# Altium schematic symbol library SCHLIB.SchLib: 2608 symbols (part 4 of 20) (continued)
## FB-BLM18AG121BH1D (continued)
FERRITE BEAD 120 OHM 0603 1 LN; Manufacturer Part Number: BLM18AG121BH1D; Manufacturer: Murata Electronics; Filter Type: Power Line; Number of Lines: 1; Impedance @ Frequency: 120 Ohms @ 100 MHz; DCR: 180mOhm; Object  Type: Part; Design Item ID: FB-BLM18AG121BH1D; Series: BLM18; Ratings: AEC-Q200; Operating Temperature: -55°C ~ 150°C; Mounting Type: Surface Mount; Height: 0.95mm; Size: 1.60mm x 0.80mm; Category: Bead
footprint FB0603
pins: 1, 2

## FB-BLM18AG121SH1D
designator FB?  Current Rating: 800mA  Package: 0603
FERRITE BEAD 120 OHM 0603 1LN; Manufacturer Part Number: BLM18AG121SH1D; Manufacturer: Murata Electronics; Number of Lines: 1; Impedance @ Frequency: 120 Ohms @ 100 MHz; DCR: 180mOhm; Object  Type: Part; Design Item ID: FB-BLM18AG121SH1D; Series: BLM18; Filter Type: -; Ratings: AEC-Q200; Operating Temperature: -55°C ~ 125°C; Mounting Type: Surface Mount; Height: 0.95mm; Size: 1.60mm x 0.80mm; Category: Bead
footprint FB0603
pins: 1, 2

## FB-BLM18AG121SZ1D
designator FB?  Current Rating: 500mA  Package: 0603
FERRITE BEAD 120 OHM 0201 1LN; Manufacturer Part Number: BLM18AG121SZ1D; Manufacturer: Murata Electronics; Filter Type: Signal Line; Number of Lines: 1; DCR: 180mOhm; Object  Type: Part; Design Item ID: FB-BLM18AG121SZ1D; Series: BLM18; Impedance @ Frequency: -; Ratings: AEC-Q200; Operating Temperature: -55°C ~ 125°C; Mounting Type: Surface Mount; Height: 0.37mm; Size: 1.60mm x 0.80mm; Category: Bead
footprint FB0603
pins: 1, 2

## FB-BLM18AG151BH1D
designator FB?  Current Rating: 700mA  Package: 0603
FERRITE BEAD 150 OHM 0603 1 LN; Manufacturer Part Number: BLM18AG151BH1D; Manufacturer: Murata Electronics; Filter Type: Power Line; Number of Lines: 1; Impedance @ Frequency: 150 Ohms @ 100 MHz; DCR: 250mOhm; Object  Type: Part; Design Item ID: FB-BLM18AG151BH1D; Series: BLM18; Ratings: AEC-Q200; Operating Temperature: -55°C ~ 150°C; Mounting Type: Surface Mount; Height: 0.95mm; Size: 1.60mm x 0.80mm; Category: Bead
footprint FB0603
pins: 1, 2

## FB-BLM18AG221BH1D
designator FB?  Current Rating: 700mA  Package: 0603
FERRITE BEAD 220 OHM 0603 1 LN; Manufacturer Part Number: BLM18AG221BH1D; Manufacturer: Murata Electronics; Filter Type: Power Line; Number of Lines: 1; Impedance @ Frequency: 220 Ohms @ 100 MHz; DCR: 250mOhm; Object  Type: Part; Design Item ID: FB-BLM18AG221BH1D; Series: BLM18; Ratings: AEC-Q200; Operating Temperature: -55°C ~ 150°C; Mounting Type: Surface Mount; Height: 0.95mm; Size: 1.60mm x 0.80mm; Category: Bead
footprint FB0603
pins: 1, 2

## FB-BLM18AG221SH1D
designator FB?  Current Rating: 700mA  Package: 0603
FERRITE BEAD 220 OHM 0603 1LN; Manufacturer Part Number: BLM18AG221SH1D; Manufacturer: Murata Electronics; Number of Lines: 1; Impedance @ Frequency: 220 Ohms @ 100 MHz; DCR: 250mOhm; Object  Type: Part; Design Item ID: FB-BLM18AG221SH1D; Series: BLM18; Filter Type: -; Ratings: AEC-Q200; Operating Temperature: -55°C ~ 125°C; Mounting Type: Surface Mount; Height: 0.95mm; Size: 1.60mm x 0.80mm; Category: Bead
footprint FB0603
pins: 1, 2

## FB-BLM18AG331BH1D
designator FB?  Current Rating: 600mA  Package: 0603
FERRITE BEAD 330 OHM 0603 1 LN; Manufacturer Part Number: BLM18AG331BH1D; Manufacturer: Murata Electronics; Filter Type: Power Line; Number of Lines: 1; Impedance @ Frequency: 330 Ohms @ 100 MHz; DCR: 300mOhm; Object  Type: Part; Design Item ID: FB-BLM18AG331BH1D; Series: BLM18; Ratings: AEC-Q200; Operating Temperature: -55°C ~ 150°C; Mounting Type: Surface Mount; Height: 0.95mm; Size: 1.60mm x 0.80mm; Category: Bead
footprint FB0603
pins: 1, 2

## FB-BLM18AG331SH1D
designator FB?  Current Rating: 600mA  Package: 0603
FERRITE BEAD 330 OHM 0603 1LN; Manufacturer Part Number: BLM18AG331SH1D; Manufacturer: Murata Electronics; Filter Type: Signal Line; Number of Lines: 1; Impedance @ Frequency: 330 Ohms @ 100 MHz; DCR: 300mOhm; Object  Type: Part; Design Item ID: FB-BLM18AG331SH1D; Series: BLM18; Ratings: AEC-Q200; Operating Temperature: -55°C ~ 125°C; Mounting Type: Surface Mount; Height: 0.95mm; Size: 1.60mm x 0.80mm; Category: Bead
footprint FB0603
pins: 1, 2

## FB-BLM18AG471BH1D
designator FB?  Current Rating: 550mA  Package: 0603
FERRITE BEAD 470 OHM 0603 1 LN; Manufacturer Part Number: BLM18AG471BH1D; Manufacturer: Murata Electronics; Filter Type: Power Line; Number of Lines: 1; Impedance @ Frequency: 470 Ohms @ 100 MHz; DCR: 350mOhm; Object  Type: Part; Design Item ID: FB-BLM18AG471BH1D; Series: BLM18; Ratings: AEC-Q200; Operating Temperature: -55°C ~ 150°C; Mounting Type: Surface Mount; Height: 0.95mm; Size: 1.60mm x 0.80mm; Category: Bead
footprint FB0603
pins: 1, 2

## FB-BLM18AG471SH1D
designator FB?  Current Rating: 550mA  Package: 0603
FERRITE BEAD 470 OHM 0603 1LN; Manufacturer Part Number: BLM18AG471SH1D; Manufacturer: Murata Electronics; Number of Lines: 1; Impedance @ Frequency: 470 Ohms @ 100 MHz; DCR: 350mOhm; Object  Type: Part; Design Item ID: FB-BLM18AG471SH1D; Series: BLM18; Filter Type: -; Ratings: AEC-Q200; Operating Temperature: -55°C ~ 125°C; Mounting Type: Surface Mount; Height: 0.95mm; Size: 1.60mm x 0.80mm; Category: Bead
footprint FB0603
pins: 1, 2

## FB-BLM18AG471WH1D
designator FB?  Current Rating: 200mA  Package: 0603
FERRITE BEAD 470 OHM 0603 1LN; Manufacturer Part Number: BLM18AG471WH1D; Manufacturer: Murata Electronics; Number of Lines: 1; Impedance @ Frequency: 470 Ohms @ 100 MHz; DCR: 200mOhm; Object  Type: Part; Design Item ID: FB-BLM18AG471WH1D; Series: BLM18; Filter Type: -; Ratings: AEC-Q200; Operating Temperature: -55°C ~ 150°C; Mounting Type: Surface Mount, Epoxy; Height: 0.95mm; Size: 1.60mm x 0.80mm; Category: Bead
footprint FB0603
pins: 1, 2

## FB-BLM18AG601BH1D
designator FB?  Current Rating: 500mA  Package: 0603
FERRITE BEAD 600 OHM 0603 1 LN; Manufacturer Part Number: BLM18AG601BH1D; Manufacturer: Murata Electronics; Filter Type: Power Line; Number of Lines: 1; Impedance @ Frequency: 600 Ohms @ 100 MHz; DCR: 380mOhm; Object  Type: Part; Design Item ID: FB-BLM18AG601BH1D; Series: BLM18; Ratings: AEC-Q200; Operating Temperature: -55°C ~ 150°C; Mounting Type: Surface Mount; Height: 0.95mm; Size: 1.60mm x 0.80mm; Category: Bead
footprint FB0603
pins: 1, 2

## FB-BLM18AG601SH1D
designator FB?  Current Rating: 500mA  Package: 0603
FERRITE BEAD 600 OHM 0603 1LN; Manufacturer Part Number: BLM18AG601SH1D; Manufacturer: Murata Electronics; Number of Lines: 1; Impedance @ Frequency: 600 Ohms @ 100 MHz; DCR: 380mOhm; Object  Type: Part; Design Item ID: FB-BLM18AG601SH1D; Series: BLM18; Filter Type: -; Ratings: AEC-Q200; Operating Temperature: -55°C ~ 125°C; Mounting Type: Surface Mount; Height: 0.95mm; Size: 1.60mm x 0.80mm; Category: Bead
footprint FB0603
pins: 1, 2

## FB-BLM18BB100SH1D
designator FB?  Current Rating: 700mA  Package: 0603
FERRITE BEAD 10 OHM 0603 1LN; Manufacturer Part Number: BLM18BB100SH1D; Manufacturer: Murata Electronics; Filter Type: Signal Line; Number of Lines: 1; Impedance @ Frequency: 10 Ohms @ 100 MHz; DCR: 100mOhm; Object  Type: Part; Design Item ID: FB-BLM18BB100SH1D; Series: BLM18; Ratings: AEC-Q200; Operating Temperature: -55°C ~ 125°C; Mounting Type: Surface Mount; Height: 0.95mm; Size: 1.60mm x 0.80mm; Category: Bead
footprint FB0603
pins: 1, 2

## FB-BLM18BB221SH1D
designator FB?  Current Rating: 450mA  Package: 0603
FERRITE BEAD 220 OHM 0603 1LN; Manufacturer Part Number: BLM18BB221SH1D; Manufacturer: Murata Electronics; Filter Type: Signal Line; Number of Lines: 1; Impedance @ Frequency: 220 Ohms @ 100 MHz; DCR: 450mOhm; Object  Type: Part; Design Item ID: FB-BLM18BB221SH1D; Series: BLM18; Ratings: AEC-Q200; Operating Temperature: -55°C ~ 125°C; Mounting Type: Surface Mount; Height: 0.95mm; Size: 1.60mm x 0.80mm; Category: Bead
footprint FB0603
pins: 1, 2

## FB-BLM18BB470SH1D
designator FB?  Current Rating: 550mA  Package: 0603
FERRITE BEAD 47 OHM 0603 1LN; Manufacturer Part Number: BLM18BB470SH1D; Manufacturer: Murata Electronics; Filter Type: Signal Line; Number of Lines: 1; Impedance @ Frequency: 47 Ohms @ 100 MHz; DCR: 250mOhm; Object  Type: Part; Design Item ID: FB-BLM18BB470SH1D; Series: BLM18; Ratings: AEC-Q200; Operating Temperature: -55°C ~ 125°C; Mounting Type: Surface Mount; Height: 0.95mm; Size: 1.60mm x 0.80mm; Category: Bead
footprint FB0603
pins: 1, 2

## FB-BLM18BD102BH1D
designator FB?  Current Rating: 200mA  Package: 0603
FERRITE BEAD 1 KOHM 0603 1 LN; Manufacturer Part Number: BLM18BD102BH1D; Manufacturer: Murata Electronics; Filter Type: Power Line; Number of Lines: 1; Impedance @ Frequency: 1 kOhms @ 100 MHz; DCR: 850mOhm; Object  Type: Part; Design Item ID: FB-BLM18BD102BH1D; Series: BLM18; Ratings: AEC-Q200; Operating Temperature: -55°C ~ 150°C; Mounting Type: Surface Mount; Height: 0.95mm; Size: 1.60mm x 0.80mm; Category: Bead
footprint FB0603
pins: 1, 2

## FB-BLM18BD102SH1D
designator FB?  Current Rating: 200mA  Package: 0603
FERRITE BEAD 1 KOHM 0603 1LN; Manufacturer Part Number: BLM18BD102SH1D; Manufacturer: Murata Electronics; Filter Type: Signal Line; Number of Lines: 1; Impedance @ Frequency: 1 kOhms @ 100 MHz; DCR: 850mOhm; Object  Type: Part; Design Item ID: FB-BLM18BD102SH1D; Series: BLM18; Ratings: AEC-Q200; Operating Temperature: -55°C ~ 125°C; Mounting Type: Surface Mount; Height: 0.95mm; Size: 1.60mm x 0.80mm; Category: Bead
footprint FB0603
pins: 1, 2

## FB-BLM18BD121BH1D
designator FB?  Current Rating: 300mA  Package: 0603
FERRITE BEAD 120 OHM 0603 1 LN; Manufacturer Part Number: BLM18BD121BH1D; Manufacturer: Murata Electronics; Filter Type: Power Line; Number of Lines: 1; Impedance @ Frequency: 120 Ohms @ 100 MHz; DCR: 400mOhm; Object  Type: Part; Design Item ID: FB-BLM18BD121BH1D; Series: BLM18; Ratings: AEC-Q200; Operating Temperature: -55°C ~ 150°C; Mounting Type: Surface Mount; Height: 0.95mm; Size: 1.60mm x 0.80mm; Category: Bead
footprint FB0603
pins: 1, 2

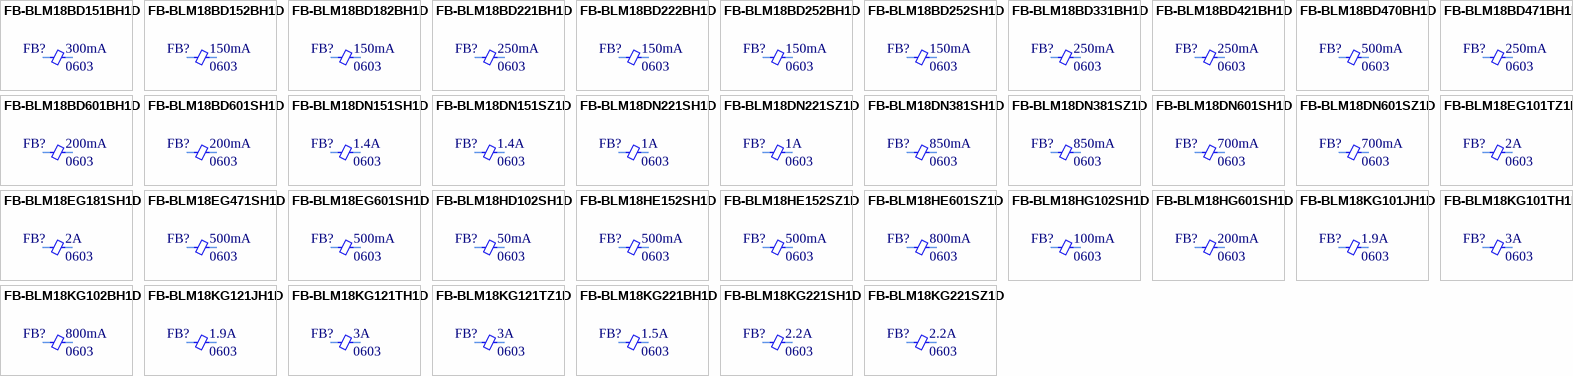
[diagram p14: symbols FB-BLM18BD151BH1D to FB-BLM18KG221SZ1D]

## FB-BLM18BD151BH1D
designator FB?  Current Rating: 300mA  Package: 0603
FERRITE BEAD 150 OHM 0603 1 LN; Manufacturer Part Number: BLM18BD151BH1D; Manufacturer: Murata Electronics; Filter Type: Power Line; Number of Lines: 1; Impedance @ Frequency: 150 Ohms @ 100 MHz; DCR: 400mOhm; Object  Type: Part; Design Item ID: FB-BLM18BD151BH1D; Series: BLM18; Ratings: AEC-Q200; Operating Temperature: -55°C ~ 150°C; Mounting Type: Surface Mount; Height: 0.95mm; Size: 1.60mm x 0.80mm; Category: Bead
footprint FB0603
pins: 1, 2

## FB-BLM18BD152BH1D
designator FB?  Current Rating: 150mA  Package: 0603
FERRITE BEAD 1.5 KOHM 0603 1 LN; Manufacturer Part Number: BLM18BD152BH1D; Manufacturer: Murata Electronics; Filter Type: Power Line; Number of Lines: 1; Impedance @ Frequency: 1.5 kOhms @ 100 MHz; DCR: 1.2Ohm; Object  Type: Part; Design Item ID: FB-BLM18BD152BH1D; Series: BLM18; Ratings: AEC-Q200; Operating Temperature: -55°C ~ 150°C; Mounting Type: Surface Mount; Height: 0.95mm; Size: 1.60mm x 0.80mm; Category: Bead
footprint FB0603
pins: 1, 2

## FB-BLM18BD182BH1D
designator FB?  Current Rating: 150mA  Package: 0603
FERRITE BEAD 1.8 KOHM 0603 1 LN; Manufacturer Part Number: BLM18BD182BH1D; Manufacturer: Murata Electronics; Filter Type: Power Line; Number of Lines: 1; Impedance @ Frequency: 1.8 kOhms @ 100 MHz; DCR: 1.5Ohm; Object  Type: Part; Design Item ID: FB-BLM18BD182BH1D; Series: BLM18; Ratings: AEC-Q200; Operating Temperature: -55°C ~ 150°C; Mounting Type: Surface Mount; Height: 0.95mm; Size: 1.60mm x 0.80mm; Category: Bead
footprint FB0603
pins: 1, 2

## FB-BLM18BD221BH1D
designator FB?  Current Rating: 250mA  Package: 0603
FERRITE BEAD 220 OHM 0603 1 LN; Manufacturer Part Number: BLM18BD221BH1D; Manufacturer: Murata Electronics; Filter Type: Power Line; Number of Lines: 1; Impedance @ Frequency: 220 Ohms @ 100 MHz; DCR: 450mOhm; Object  Type: Part; Design Item ID: FB-BLM18BD221BH1D; Series: BLM18; Ratings: AEC-Q200; Operating Temperature: -55°C ~ 150°C; Mounting Type: Surface Mount; Height: 0.95mm; Size: 1.60mm x 0.80mm; Category: Bead
footprint FB0603
pins: 1, 2

## FB-BLM18BD222BH1D
designator FB?  Current Rating: 150mA  Package: 0603
FERRITE BEAD 2.2 KOHM 0603 1 LN; Manufacturer Part Number: BLM18BD222BH1D; Manufacturer: Murata Electronics; Filter Type: Power Line; Number of Lines: 1; Impedance @ Frequency: 2.2 kOhms @ 100 MHz; DCR: 1.5Ohm; Object  Type: Part; Design Item ID: FB-BLM18BD222BH1D; Series: BLM18; Ratings: AEC-Q200; Operating Temperature: -55°C ~ 150°C; Mounting Type: Surface Mount; Height: 0.95mm; Size: 1.60mm x 0.80mm; Category: Bead
footprint FB0603
pins: 1, 2

## FB-BLM18BD252BH1D
designator FB?  Current Rating: 150mA  Package: 0603
FERRITE BEAD 2.5 KOHM 0603 1 LN; Manufacturer Part Number: BLM18BD252BH1D; Manufacturer: Murata Electronics; Filter Type: Power Line; Number of Lines: 1; Impedance @ Frequency: 2.5 kOhms @ 100 MHz; DCR: 1.5Ohm; Object  Type: Part; Design Item ID: FB-BLM18BD252BH1D; Series: BLM18; Ratings: AEC-Q200; Operating Temperature: -55°C ~ 150°C; Mounting Type: Surface Mount; Height: 0.95mm; Size: 1.60mm x 0.80mm; Category: Bead
footprint FB0603
pins: 1, 2

## FB-BLM18BD252SH1D
designator FB?  Current Rating: 150mA  Package: 0603
FERRITE BEAD 2.5 KOHM 0603 1LN; Manufacturer Part Number: BLM18BD252SH1D; Manufacturer: Murata Electronics; Filter Type: Signal Line; Number of Lines: 1; Impedance @ Frequency: 2.5 kOhms @ 100 MHz; DCR: 1.5Ohm; Object  Type: Part; Design Item ID: FB-BLM18BD252SH1D; Series: BLM18; Ratings: AEC-Q200; Operating Temperature: -55°C ~ 125°C; Mounting Type: Surface Mount; Height: 0.95mm; Size: 1.60mm x 0.80mm; Category: Bead
footprint FB0603
pins: 1, 2

## FB-BLM18BD331BH1D
designator FB?  Current Rating: 250mA  Package: 0603
FERRITE BEAD 330 OHM 0603 1 LN; Manufacturer Part Number: BLM18BD331BH1D; Manufacturer: Murata Electronics; Filter Type: Power Line; Number of Lines: 1; Impedance @ Frequency: 330 Ohms @ 100 MHz; DCR: 500mOhm; Object  Type: Part; Design Item ID: FB-BLM18BD331BH1D; Series: BLM18; Ratings: AEC-Q200; Operating Temperature: -55°C ~ 150°C; Mounting Type: Surface Mount; Height: 0.95mm; Size: 1.60mm x 0.80mm; Category: Bead
footprint FB0603
pins: 1, 2

## FB-BLM18BD421BH1D
designator FB?  Current Rating: 250mA  Package: 0603
FERRITE BEAD 420 OHM 0603 1 LN; Manufacturer Part Number: BLM18BD421BH1D; Manufacturer: Murata Electronics; Filter Type: Power Line; Number of Lines: 1; Impedance @ Frequency: 420 Ohms @ 100 MHz; DCR: 550mOhm; Object  Type: Part; Design Item ID: FB-BLM18BD421BH1D; Series: BLM18; Ratings: AEC-Q200; Operating Temperature: -55°C ~ 150°C; Mounting Type: Surface Mount; Height: 0.95mm; Size: 1.60mm x 0.80mm; Category: Bead
footprint FB0603
pins: 1, 2

## FB-BLM18BD470BH1D
designator FB?  Current Rating: 500mA  Package: 0603
FERRITE BEAD 47 OHM 0603 1 LN; Manufacturer Part Number: BLM18BD470BH1D; Manufacturer: Murata Electronics; Filter Type: Power Line; Number of Lines: 1; Impedance @ Frequency: 47 Ohms @ 100 MHz; DCR: 300mOhm; Object  Type: Part; Design Item ID: FB-BLM18BD470BH1D; Series: BLM18; Ratings: AEC-Q200; Operating Temperature: -55°C ~ 150°C; Mounting Type: Surface Mount; Height: 0.95mm; Size: 1.60mm x 0.80mm; Category: Bead
footprint FB0603
pins: 1, 2

## FB-BLM18BD471BH1D
designator FB?  Current Rating: 250mA  Package: 0603
FERRITE BEAD 470 OHM 0603 1 LN; Manufacturer Part Number: BLM18BD471BH1D; Manufacturer: Murata Electronics; Filter Type: Power Line; Number of Lines: 1; Impedance @ Frequency: 470 Ohms @ 100 MHz; DCR: 550mOhm; Object  Type: Part; Design Item ID: FB-BLM18BD471BH1D; Series: BLM18; Ratings: AEC-Q200; Operating Temperature: -55°C ~ 150°C; Mounting Type: Surface Mount; Height: 0.95mm; Size: 1.60mm x 0.80mm; Category: Bead
footprint FB0603
pins: 1, 2

## FB-BLM18BD601BH1D
designator FB?  Current Rating: 200mA  Package: 0603
FERRITE BEAD 600 OHM 0603 1 LN; Manufacturer Part Number: BLM18BD601BH1D; Manufacturer: Murata Electronics; Filter Type: Power Line; Number of Lines: 1; Impedance @ Frequency: 600 Ohms @ 100 MHz; DCR: 650mOhm; Object  Type: Part; Design Item ID: FB-BLM18BD601BH1D; Series: BLM18; Ratings: AEC-Q200; Operating Temperature: -55°C ~ 150°C; Mounting Type: Surface Mount; Height: 0.95mm; Size: 1.60mm x 0.80mm; Category: Bead
footprint FB0603
pins: 1, 2

## FB-BLM18BD601SH1D
designator FB?  Current Rating: 200mA  Package: 0603
FERRITE BEAD 600 OHM 0603 1LN; Manufacturer Part Number: BLM18BD601SH1D; Manufacturer: Murata Electronics; Filter Type: Signal Line; Number of Lines: 1; Impedance @ Frequency: 600 Ohms @ 100 MHz; DCR: 650mOhm; Object  Type: Part; Design Item ID: FB-BLM18BD601SH1D; Series: BLM18; Ratings: AEC-Q200; Operating Temperature: -55°C ~ 125°C; Mounting Type: Surface Mount; Height: 0.95mm; Size: 1.60mm x 0.80mm; Category: Bead
footprint FB0603
pins: 1, 2

## FB-BLM18DN151SH1D
designator FB?  Current Rating: 1.4A  Package: 0603
FERRITE BEAD 150 OHM 0603 1LN; Manufacturer Part Number: BLM18DN151SH1D; Manufacturer: Murata Electronics; Number of Lines: 1; Impedance @ Frequency: 150 Ohms @ 100 MHz; Object  Type: Part; Design Item ID: FB-BLM18DN151SH1D; Series: BLM18; Filter Type: -; DCR: -; Ratings: AEC-Q200; Operating Temperature: -55°C ~ 125°C; Mounting Type: Surface Mount; Height: 0.95mm; Size: 1.60mm x 0.80mm; Category: Bead
footprint FB0603
pins: 1, 2

## FB-BLM18DN151SZ1D
designator FB?  Current Rating: 1.4A  Package: 0603
FERRITE BEAD 150 OHM 0603 1LN; Manufacturer Part Number: BLM18DN151SZ1D; Manufacturer: Murata Electronics; Number of Lines: 1; Impedance @ Frequency: 150 Ohms @ 100 MHz; Object  Type: Part; Design Item ID: FB-BLM18DN151SZ1D; Series: BLM18; Filter Type: -; DCR: -; Ratings: AEC-Q200; Operating Temperature: -55°C ~ 125°C; Mounting Type: Surface Mount; Height: 0.95mm; Size: 1.60mm x 0.80mm; Category: Bead
footprint FB0603
pins: 1, 2

## FB-BLM18DN221SH1D
designator FB?  Current Rating: 1A  Package: 0603
FERRITE BEAD 220 OHM 0603 1LN; Manufacturer Part Number: BLM18DN221SH1D; Manufacturer: Murata Electronics; Number of Lines: 1; Impedance @ Frequency: 220 Ohms @ 100 MHz; Object  Type: Part; Design Item ID: FB-BLM18DN221SH1D; Series: BLM18; Filter Type: -; DCR: -; Ratings: AEC-Q200; Operating Temperature: -55°C ~ 125°C; Mounting Type: Surface Mount; Height: 0.95mm; Size: 1.60mm x 0.80mm; Category: Bead
footprint FB0603
pins: 1, 2

## FB-BLM18DN221SZ1D
designator FB?  Current Rating: 1A  Package: 0603
FERRITE BEAD 220 OHM 0603 1 LN; Manufacturer Part Number: BLM18DN221SZ1D; Manufacturer: Murata Electronics; Number of Lines: 1; Impedance @ Frequency: 220 Ohms @ 100 MHz; Object  Type: Part; Design Item ID: FB-BLM18DN221SZ1D; Series: BLM18; Filter Type: -; DCR: -; Ratings: AEC-Q200; Operating Temperature: -55°C ~ 125°C; Mounting Type: Surface Mount; Height: 0.95mm; Size: 1.60mm x 0.80mm; Category: Bead
footprint FB0603
pins: 1, 2

## FB-BLM18DN381SH1D
designator FB?  Current Rating: 850mA  Package: 0603
FERRITE BEAD 380 OHM 0603 1 LN; Manufacturer Part Number: BLM18DN381SH1D; Manufacturer: Murata Electronics; Number of Lines: 1; Impedance @ Frequency: 380 Ohms @ 100 MHz; Object  Type: Part; Design Item ID: FB-BLM18DN381SH1D; Series: BLM18; Filter Type: -; DCR: -; Ratings: AEC-Q200; Operating Temperature: -55°C ~ 125°C; Mounting Type: Surface Mount; Height: 0.95mm; Size: 1.60mm x 0.80mm; Category: Bead
footprint FB0603
pins: 1, 2

## FB-BLM18DN381SZ1D
designator FB?  Current Rating: 850mA  Package: 0603
FERRITE BEAD 380 OHM 0603 1 LN; Manufacturer Part Number: BLM18DN381SZ1D; Manufacturer: Murata Electronics; Number of Lines: 1; Impedance @ Frequency: 380 Ohms @ 100 MHz; Object  Type: Part; Design Item ID: FB-BLM18DN381SZ1D; Series: BLM18; Filter Type: -; DCR: -; Ratings: AEC-Q200; Operating Temperature: -55°C ~ 125°C; Mounting Type: Surface Mount; Height: 0.95mm; Size: 1.60mm x 0.80mm; Category: Bead
footprint FB0603
pins: 1, 2

## FB-BLM18DN601SH1D
designator FB?  Current Rating: 700mA  Package: 0603
FERRITE BEAD 600 OHM 0603 1 LN; Manufacturer Part Number: BLM18DN601SH1D; Manufacturer: Murata Electronics; Number of Lines: 1; Impedance @ Frequency: 600 Ohms @ 100 MHz; Object  Type: Part; Design Item ID: FB-BLM18DN601SH1D; Series: BLM18; Filter Type: -; DCR: -; Ratings: AEC-Q200; Operating Temperature: -55°C ~ 125°C; Mounting Type: Surface Mount; Height: 0.95mm; Size: 1.60mm x 0.80mm; Category: Bead
footprint FB0603
pins: 1, 2

## FB-BLM18DN601SZ1D
designator FB?  Current Rating: 700mA  Package: 0603
FERRITE BEAD 600 OHM 0603 1 LN; Manufacturer Part Number: BLM18DN601SZ1D; Manufacturer: Murata Electronics; Number of Lines: 1; Impedance @ Frequency: 600 Ohms @ 100 MHz; Object  Type: Part; Design Item ID: FB-BLM18DN601SZ1D; Series: BLM18; Filter Type: -; DCR: -; Ratings: AEC-Q200; Operating Temperature: -55°C ~ 125°C; Mounting Type: Surface Mount; Height: 0.95mm; Size: 1.60mm x 0.80mm; Category: Bead
footprint FB0603
pins: 1, 2

## FB-BLM18EG101TZ1D
designator FB?  Current Rating: 2A  Package: 0603
FERRITE BEAD 100 OHM 0603 1LN; Manufacturer Part Number: BLM18EG101TZ1D; Manufacturer: Murata Electronics; Filter Type: Power, Signal Line; Number of Lines: 1; DCR: 45mOhm; Object  Type: Part; Design Item ID: FB-BLM18EG101TZ1D; Series: BLM18; Impedance @ Frequency: -; Ratings: AEC-Q200; Operating Temperature: -55°C ~ 125°C; Mounting Type: Surface Mount; Height: 0.75mm; Size: 1.60mm x 0.80mm; Category: Bead
footprint FB0603
pins: 1, 2

## FB-BLM18EG181SH1D
designator FB?  Current Rating: 2A  Package: 0603
FERRITE BEAD 180 OHM 0603 1LN; Manufacturer Part Number: BLM18EG181SH1D; Manufacturer: Murata Electronics; Number of Lines: 1; Impedance @ Frequency: 180 Ohms @ 100 MHz; DCR: 50mOhm; Object  Type: Part; Design Item ID: FB-BLM18EG181SH1D; Series: BLM18; Filter Type: -; Ratings: AEC-Q200; Operating Temperature: -55°C ~ 125°C; Mounting Type: Surface Mount; Height: 0.95mm; Size: 1.60mm x 0.80mm; Category: Bead
footprint FB0603
pins: 1, 2

## FB-BLM18EG471SH1D
designator FB?  Current Rating: 500mA  Package: 0603
FERRITE BEAD 470 OHM 0603 1LN; Manufacturer Part Number: BLM18EG471SH1D; Manufacturer: Murata Electronics; Number of Lines: 1; Impedance @ Frequency: 470 Ohms @ 100 MHz; DCR: 210mOhm; Object  Type: Part; Design Item ID: FB-BLM18EG471SH1D; Series: BLM18; Filter Type: -; Ratings: AEC-Q200; Operating Temperature: -55°C ~ 125°C; Mounting Type: Surface Mount; Height: 0.95mm; Size: 1.60mm x 0.80mm; Category: Bead
footprint FB0603
pins: 1, 2

## FB-BLM18EG601SH1D
designator FB?  Current Rating: 500mA  Package: 0603
FERRITE BEAD 600 OHM 0603 1LN; Manufacturer Part Number: BLM18EG601SH1D; Manufacturer: Murata Electronics; Number of Lines: 1; Impedance @ Frequency: 600 Ohms @ 100 MHz; DCR: 350mOhm; Object  Type: Part; Design Item ID: FB-BLM18EG601SH1D; Series: BLM18; Filter Type: -; Ratings: AEC-Q200; Operating Temperature: -55°C ~ 125°C; Mounting Type: Surface Mount; Height: 0.95mm; Size: 1.60mm x 0.80mm; Category: Bead
footprint FB0603
pins: 1, 2

## FB-BLM18HD102SH1D
designator FB?  Current Rating: 50mA  Package: 0603
FERRITE BEAD 1 KOHM 0603 1LN; Manufacturer Part Number: BLM18HD102SH1D; Manufacturer: Murata Electronics; Filter Type: Signal Line; Number of Lines: 1; Impedance @ Frequency: 1 kOhms @ 100 MHz; DCR: 1.8Ohm; Object  Type: Part; Design Item ID: FB-BLM18HD102SH1D; Series: BLM18; Ratings: AEC-Q200; Operating Temperature: -55°C ~ 125°C; Mounting Type: Surface Mount; Height: 0.95mm; Size: 1.60mm x 0.80mm; Category: Bead
footprint FB0603
pins: 1, 2

## FB-BLM18HE152SH1D
designator FB?  Current Rating: 500mA  Package: 0603
FERRITE BEAD 1.5 KOHM 0603 1 LN; Manufacturer Part Number: BLM18HE152SH1D; Manufacturer: Murata Electronics; Filter Type: Signal Line; Number of Lines: 1; Impedance @ Frequency: 1.5 kOhms @ 100 MHz; DCR: 500mOhm; Object  Type: Part; Design Item ID: FB-BLM18HE152SH1D; Series: BLM18; Ratings: AEC-Q200; Operating Temperature: -55°C ~ 125°C; Mounting Type: Surface Mount; Height: 0.95mm; Size: 1.60mm x 0.80mm; Category: Bead
footprint FB0603
pins: 1, 2

## FB-BLM18HE152SZ1D
designator FB?  Current Rating: 500mA  Package: 0603
FERRITE BEAD 1.5 KOHM 0603 1LN; Manufacturer Part Number: BLM18HE152SZ1D; Manufacturer: Murata Electronics; Filter Type: Signal Line; Number of Lines: 1; Impedance @ Frequency: 1.5 kOhms @ 100 MHz; DCR: 500mOhm; Object  Type: Part; Design Item ID: FB-BLM18HE152SZ1D; Series: BLM18; Ratings: AEC-Q200; Operating Temperature: -55°C ~ 125°C; Mounting Type: Surface Mount; Height: 0.95mm; Size: 1.60mm x 0.80mm; Category: Bead
footprint FB0603
pins: 1, 2

## FB-BLM18HE601SZ1D
designator FB?  Current Rating: 800mA  Package: 0603
FERRITE BEAD 600 OHM 0603 1LN; Manufacturer Part Number: BLM18HE601SZ1D; Manufacturer: Murata Electronics; Filter Type: Signal Line; Number of Lines: 1; Impedance @ Frequency: 600 Ohms @ 100 MHz; DCR: 250mOhm; Object  Type: Part; Design Item ID: FB-BLM18HE601SZ1D; Series: BLM18; Ratings: AEC-Q200; Operating Temperature: -55°C ~ 125°C; Mounting Type: Surface Mount; Height: 0.95mm; Size: 1.60mm x 0.80mm; Category: Bead
footprint FB0603
pins: 1, 2

## FB-BLM18HG102SH1D
designator FB?  Current Rating: 100mA  Package: 0603
FERRITE BEAD 1 KOHM 0603 1LN; Manufacturer Part Number: BLM18HG102SH1D; Manufacturer: Murata Electronics; Number of Lines: 1; Impedance @ Frequency: 1 kOhms @ 100 MHz; DCR: 1.6Ohm; Object  Type: Part; Design Item ID: FB-BLM18HG102SH1D; Series: BLM18; Filter Type: -; Ratings: AEC-Q200; Operating Temperature: -55°C ~ 125°C; Mounting Type: Surface Mount; Height: 0.95mm; Size: 1.60mm x 0.80mm; Category: Bead
footprint FB0603
pins: 1, 2

## FB-BLM18HG601SH1D
designator FB?  Current Rating: 200mA  Package: 0603
FERRITE BEAD 600 OHM 0603 1LN; Manufacturer Part Number: BLM18HG601SH1D; Manufacturer: Murata Electronics; Number of Lines: 1; Impedance @ Frequency: 600 Ohms @ 100 MHz; DCR: 1Ohm; Object  Type: Part; Design Item ID: FB-BLM18HG601SH1D; Series: BLM18; Filter Type: -; Ratings: AEC-Q200; Operating Temperature: -55°C ~ 125°C; Mounting Type: Surface Mount; Height: 0.95mm; Size: 1.60mm x 0.80mm; Category: Bead
footprint FB0603
pins: 1, 2

## FB-BLM18KG101JH1D
designator FB?  Current Rating: 1.9A  Package: 0603
FERRITE BEAD 100 OHM 0603 1 LN; Manufacturer Part Number: BLM18KG101JH1D; Manufacturer: Murata Electronics; Filter Type: Power Line; Number of Lines: 1; Impedance @ Frequency: 100 Ohms @ 100 MHz; DCR: 30mOhm; Object  Type: Part; Design Item ID: FB-BLM18KG101JH1D; Series: BLM18; Ratings: AEC-Q200; Operating Temperature: -55°C ~ 150°C; Mounting Type: Surface Mount; Height: 0.75mm; Size: 1.60mm x 0.80mm; Category: Bead
footprint FB0603
pins: 1, 2

## FB-BLM18KG101TH1D
designator FB?  Current Rating: 3A  Package: 0603
FERRITE BEAD 100 OHM 0603 1LN; Manufacturer Part Number: BLM18KG101TH1D; Manufacturer: Murata Electronics; Filter Type: Power Line; Number of Lines: 1; Impedance @ Frequency: 100 Ohms @ 100 MHz; DCR: 30mOhm; Object  Type: Part; Design Item ID: FB-BLM18KG101TH1D; Series: BLM18; Ratings: AEC-Q200; Operating Temperature: -55°C ~ 125°C; Mounting Type: Surface Mount; Height: 0.75mm; Size: 1.60mm x 0.80mm; Category: Bead
footprint FB0603
pins: 1, 2

## FB-BLM18KG102BH1D
designator FB?  Current Rating: 800mA  Package: 0603
FERRITE BEAD 1 KOHM 0603 1LN; Manufacturer Part Number: BLM18KG102BH1D; Manufacturer: Murata Electronics; Filter Type: Power Line; Number of Lines: 1; Impedance @ Frequency: 1 kOhms @ 100 MHz; DCR: 200mOhm; Object  Type: Part; Design Item ID: FB-BLM18KG102BH1D; Series: BLM18; Ratings: AEC-Q200; Operating Temperature: -55°C ~ 150°C; Mounting Type: Surface Mount; Height: 0.95mm; Size: 1.60mm x 0.80mm; Category: Bead
footprint FB0603
pins: 1, 2

## FB-BLM18KG121JH1D
designator FB?  Current Rating: 1.9A  Package: 0603
FERRITE BEAD 120 OHM 0603 1 LN; Manufacturer Part Number: BLM18KG121JH1D; Manufacturer: Murata Electronics; Filter Type: Power Line; Number of Lines: 1; Impedance @ Frequency: 120 Ohms @ 100 MHz; DCR: 30mOhm; Object  Type: Part; Design Item ID: FB-BLM18KG121JH1D; Series: BLM18; Ratings: AEC-Q200; Operating Temperature: -55°C ~ 150°C; Mounting Type: Surface Mount; Height: 0.75mm; Size: 1.60mm x 0.80mm; Category: Bead
footprint FB0603
pins: 1, 2

## FB-BLM18KG121TH1D
designator FB?  Current Rating: 3A  Package: 0603
FERRITE BEAD 120 OHM 0603 1LN; Manufacturer Part Number: BLM18KG121TH1D; Manufacturer: Murata Electronics; Filter Type: Power Line; Number of Lines: 1; Impedance @ Frequency: 120 Ohms @ 100 MHz; DCR: 30mOhm; Object  Type: Part; Design Item ID: FB-BLM18KG121TH1D; Series: BLM18; Ratings: AEC-Q200; Operating Temperature: -55°C ~ 125°C; Mounting Type: Surface Mount; Height: 0.75mm; Size: 1.60mm x 0.80mm; Category: Bead
footprint FB0603
pins: 1, 2

## FB-BLM18KG121TZ1D
designator FB?  Current Rating: 3A  Package: 0603
FERRITE BEAD 120 OHM 0603 1LN; Manufacturer Part Number: BLM18KG121TZ1D; Manufacturer: Murata Electronics; Filter Type: Power Line; Number of Lines: 1; Impedance @ Frequency: 120 Ohms @ 100 MHz; DCR: 30mOhm; Object  Type: Part; Design Item ID: FB-BLM18KG121TZ1D; Series: BLM18; Ratings: AEC-Q200; Operating Temperature: -55°C ~ 125°C; Mounting Type: Surface Mount; Height: 0.75mm; Size: 1.60mm x 0.80mm; Category: Bead
footprint FB0603
pins: 1, 2

## FB-BLM18KG221BH1D
designator FB?  Current Rating: 1.5A  Package: 0603
FERRITE BEAD 220 OHM 0603 1 LN; Manufacturer Part Number: BLM18KG221BH1D; Manufacturer: Murata Electronics; Filter Type: Power Line; Number of Lines: 1; Impedance @ Frequency: 220 Ohms @ 100 MHz; DCR: 50mOhm; Object  Type: Part; Design Item ID: FB-BLM18KG221BH1D; Series: BLM18; Ratings: AEC-Q200; Operating Temperature: -55°C ~ 150°C; Mounting Type: Surface Mount; Height: 0.95mm; Size: 1.60mm x 0.80mm; Category: Bead
footprint FB0603
pins: 1, 2

## FB-BLM18KG221SH1D
designator FB?  Current Rating: 2.2A  Package: 0603
FERRITE BEAD 220 OHM 0603 1LN; Manufacturer Part Number: BLM18KG221SH1D; Manufacturer: Murata Electronics; Filter Type: Power Line; Number of Lines: 1; Impedance @ Frequency: 220 Ohms @ 100 MHz; DCR: 50mOhm; Object  Type: Part; Design Item ID: FB-BLM18KG221SH1D; Series: BLM18; Ratings: AEC-Q200; Operating Temperature: -55°C ~ 125°C; Mounting Type: Surface Mount; Height: 0.95mm; Size: 1.60mm x 0.80mm; Category: Bead
footprint FB0603
pins: 1, 2

## FB-BLM18KG221SZ1D
designator FB?  Current Rating: 2.2A  Package: 0603
FERRITE BEAD 220 OHM 0603 1LN; Manufacturer Part Number: BLM18KG221SZ1D; Manufacturer: Murata Electronics; Filter Type: Power Line; Number of Lines: 1; Impedance @ Frequency: 220 Ohms @ 100 MHz; DCR: 50mOhm; Object  Type: Part; Design Item ID: FB-BLM18KG221SZ1D; Series: BLM18; Ratings: AEC-Q200; Operating Temperature: -55°C ~ 125°C; Mounting Type: Surface Mount; Height: 0.95mm; Size: 1.60mm x 0.80mm; Category: Bead
footprint FB0603
pins: 1, 2

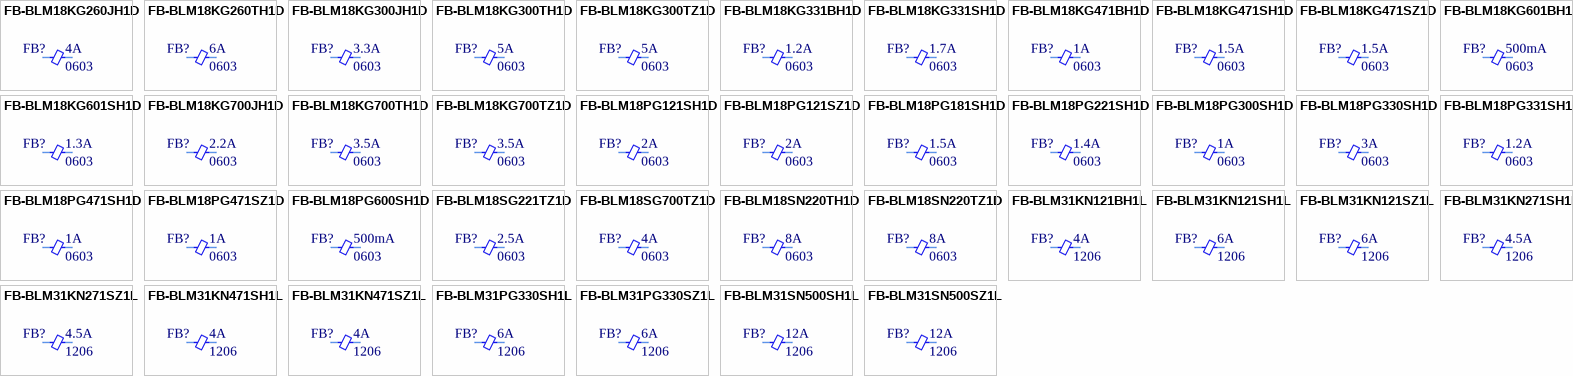
[diagram p15: symbols FB-BLM18KG260JH1D to FB-BLM31SN500SZ1L]

## FB-BLM18KG260JH1D
designator FB?  Current Rating: 4A  Package: 0603
FERRITE BEAD 26 OHM 0603 1 LN; Manufacturer Part Number: BLM18KG260JH1D; Manufacturer: Murata Electronics; Filter Type: Power Line; Number of Lines: 1; Impedance @ Frequency: 26 Ohms @ 100 MHz; DCR: 7mOhm; Object  Type: Part; Design Item ID: FB-BLM18KG260JH1D; Series: BLM18; Ratings: AEC-Q200; Operating Temperature: -55°C ~ 150°C; Mounting Type: Surface Mount; Height: 0.75mm; Size: 1.60mm x 0.80mm; Category: Bead
footprint FB0603
pins: 1, 2

## FB-BLM18KG260TH1D
designator FB?  Current Rating: 6A  Package: 0603
FERRITE BEAD 26 OHM 0603 1LN; Manufacturer Part Number: BLM18KG260TH1D; Manufacturer: Murata Electronics; Filter Type: Power Line; Number of Lines: 1; Impedance @ Frequency: 26 Ohms @ 100 MHz; DCR: 7mOhm; Object  Type: Part; Design Item ID: FB-BLM18KG260TH1D; Series: BLM18; Ratings: AEC-Q200; Operating Temperature: -55°C ~ 125°C; Mounting Type: Surface Mount; Height: 0.75mm; Size: 1.60mm x 0.80mm; Category: Bead
footprint FB0603
pins: 1, 2

## FB-BLM18KG300JH1D
designator FB?  Current Rating: 3.3A  Package: 0603
FERRITE BEAD 30 OHM 0603 1 LN; Manufacturer Part Number: BLM18KG300JH1D; Manufacturer: Murata Electronics; Filter Type: Power Line; Number of Lines: 1; Impedance @ Frequency: 30 Ohms @ 100 MHz; DCR: 10mOhm; Object  Type: Part; Design Item ID: FB-BLM18KG300JH1D; Series: BLM18; Ratings: AEC-Q200; Operating Temperature: -55°C ~ 150°C; Mounting Type: Surface Mount; Height: 0.75mm; Size: 1.60mm x 0.80mm; Category: Bead
footprint FB0603
pins: 1, 2

## FB-BLM18KG300TH1D
designator FB?  Current Rating: 5A  Package: 0603
FERRITE BEAD 30 OHM 0603 1LN; Manufacturer Part Number: BLM18KG300TH1D; Manufacturer: Murata Electronics; Filter Type: Power Line; Number of Lines: 1; Impedance @ Frequency: 30 Ohms @ 100 MHz; DCR: 10mOhm; Object  Type: Part; Design Item ID: FB-BLM18KG300TH1D; Series: BLM18; Ratings: AEC-Q200; Operating Temperature: -55°C ~ 125°C; Mounting Type: Surface Mount; Height: 0.75mm; Size: 1.60mm x 0.80mm; Category: Bead
footprint FB0603
pins: 1, 2

## FB-BLM18KG300TZ1D
designator FB?  Current Rating: 5A  Package: 0603
FERRITE BEAD 30 OHM 0603 1LN; Manufacturer Part Number: BLM18KG300TZ1D; Manufacturer: Murata Electronics; Filter Type: Power Line; Number of Lines: 1; Impedance @ Frequency: 30 Ohms @ 100 MHz; DCR: 10mOhm; Object  Type: Part; Design Item ID: FB-BLM18KG300TZ1D; Series: BLM18; Ratings: AEC-Q200; Operating Temperature: -55°C ~ 125°C; Mounting Type: Surface Mount; Height: 0.75mm; Size: 1.60mm x 0.80mm; Category: Bead
footprint FB0603
pins: 1, 2

## FB-BLM18KG331BH1D
designator FB?  Current Rating: 1.2A  Package: 0603
FERRITE BEAD 330 OHM 0603 1 LN; Manufacturer Part Number: BLM18KG331BH1D; Manufacturer: Murata Electronics; Filter Type: Power Line; Number of Lines: 1; Impedance @ Frequency: 330 Ohms @ 100 MHz; DCR: 80mOhm; Object  Type: Part; Design Item ID: FB-BLM18KG331BH1D; Series: BLM18; Ratings: AEC-Q200; Operating Temperature: -55°C ~ 150°C; Mounting Type: Surface Mount; Height: 0.95mm; Size: 1.60mm x 0.80mm; Category: Bead
footprint FB0603
pins: 1, 2

## FB-BLM18KG331SH1D
designator FB?  Current Rating: 1.7A  Package: 0603
FERRITE BEAD 330 OHM 0603 1LN; Manufacturer Part Number: BLM18KG331SH1D; Manufacturer: Murata Electronics; Filter Type: Power Line; Number of Lines: 1; Impedance @ Frequency: 330 Ohms @ 100 MHz; DCR: 80mOhm; Object  Type: Part; Design Item ID: FB-BLM18KG331SH1D; Series: BLM18; Ratings: AEC-Q200; Operating Temperature: -55°C ~ 125°C; Mounting Type: Surface Mount; Height: 0.95mm; Size: 1.60mm x 0.80mm; Category: Bead
footprint FB0603
pins: 1, 2

## FB-BLM18KG471BH1D
designator FB?  Current Rating: 1A  Package: 0603
FERRITE BEAD 470 OHM 0603 1 LN; Manufacturer Part Number: BLM18KG471BH1D; Manufacturer: Murata Electronics; Filter Type: Power Line; Number of Lines: 1; Impedance @ Frequency: 470 Ohms @ 100 MHz; DCR: 130mOhm; Object  Type: Part; Design Item ID: FB-BLM18KG471BH1D; Series: BLM18; Ratings: AEC-Q200; Operating Temperature: -55°C ~ 150°C; Mounting Type: Surface Mount; Height: 0.95mm; Size: 1.60mm x 0.80mm; Category: Bead
footprint FB0603
pins: 1, 2

## FB-BLM18KG471SH1D
designator FB?  Current Rating: 1.5A  Package: 0603
FERRITE BEAD 470 OHM 0603 1LN; Manufacturer Part Number: BLM18KG471SH1D; Manufacturer: Murata Electronics; Filter Type: Power Line; Number of Lines: 1; Impedance @ Frequency: 470 Ohms @ 100 MHz; DCR: 130mOhm; Object  Type: Part; Design Item ID: FB-BLM18KG471SH1D; Series: BLM18; Ratings: AEC-Q200; Operating Temperature: -55°C ~ 125°C; Mounting Type: Surface Mount; Height: 0.95mm; Size: 1.60mm x 0.80mm; Category: Bead
footprint FB0603
pins: 1, 2

## FB-BLM18KG471SZ1D
designator FB?  Current Rating: 1.5A  Package: 0603
FERRITE BEAD 470 OHM 0603 1LN; Manufacturer Part Number: BLM18KG471SZ1D; Manufacturer: Murata Electronics; Filter Type: Power Line; Number of Lines: 1; Impedance @ Frequency: 470 Ohms @ 100 MHz; DCR: 130mOhm; Object  Type: Part; Design Item ID: FB-BLM18KG471SZ1D; Series: BLM18; Ratings: AEC-Q200; Operating Temperature: -55°C ~ 125°C; Mounting Type: Surface Mount; Height: 0.95mm; Size: 1.60mm x 0.80mm; Category: Bead
footprint FB0603
pins: 1, 2

## FB-BLM18KG601BH1D
designator FB?  Current Rating: 500mA  Package: 0603
FERRITE BEAD 600 OHM 0603 1 LN; Manufacturer Part Number: BLM18KG601BH1D; Manufacturer: Murata Electronics; Filter Type: Power Line; Number of Lines: 1; Impedance @ Frequency: 600 Ohms @ 100 MHz; DCR: 150mOhm; Object  Type: Part; Design Item ID: FB-BLM18KG601BH1D; Series: BLM18; Ratings: AEC-Q200; Operating Temperature: -55°C ~ 150°C; Mounting Type: Surface Mount; Height: 0.95mm; Size: 1.60mm x 0.80mm; Category: Bead
footprint FB0603
pins: 1, 2

## FB-BLM18KG601SH1D
designator FB?  Current Rating: 1.3A  Package: 0603
FERRITE BEAD 600 OHM 0603 1LN; Manufacturer Part Number: BLM18KG601SH1D; Manufacturer: Murata Electronics; Filter Type: Power Line; Number of Lines: 1; Impedance @ Frequency: 600 Ohms @ 100 MHz; DCR: 150mOhm; Object  Type: Part; Design Item ID: FB-BLM18KG601SH1D; Series: BLM18; Ratings: AEC-Q200; Operating Temperature: -55°C ~ 125°C; Mounting Type: Surface Mount; Height: 0.95mm; Size: 1.60mm x 0.80mm; Category: Bead
footprint FB0603
pins: 1, 2

## FB-BLM18KG700JH1D
designator FB?  Current Rating: 2.2A  Package: 0603
FERRITE BEAD 70 OHM 0603 1 LN; Manufacturer Part Number: BLM18KG700JH1D; Manufacturer: Murata Electronics; Filter Type: Power Line; Number of Lines: 1; Impedance @ Frequency: 70 Ohms @ 100 MHz; DCR: 22mOhm; Object  Type: Part; Design Item ID: FB-BLM18KG700JH1D; Series: BLM18; Ratings: AEC-Q200; Operating Temperature: -55°C ~ 150°C; Mounting Type: Surface Mount; Height: 0.75mm; Size: 1.60mm x 0.80mm; Category: Bead
footprint FB0603
pins: 1, 2

## FB-BLM18KG700TH1D
designator FB?  Current Rating: 3.5A  Package: 0603
FERRITE BEAD 70 OHM 0603 1LN; Manufacturer Part Number: BLM18KG700TH1D; Manufacturer: Murata Electronics; Filter Type: Power Line; Number of Lines: 1; Impedance @ Frequency: 70 Ohms @ 100 MHz; DCR: 22mOhm; Object  Type: Part; Design Item ID: FB-BLM18KG700TH1D; Series: BLM18; Ratings: AEC-Q200; Operating Temperature: -55°C ~ 125°C; Mounting Type: Surface Mount; Height: 0.75mm; Size: 1.60mm x 0.80mm; Category: Bead
footprint FB0603
pins: 1, 2

## FB-BLM18KG700TZ1D
designator FB?  Current Rating: 3.5A  Package: 0603
FERRITE BEAD 0603 1LN; Manufacturer Part Number: BLM18KG700TZ1D; Manufacturer: Murata Electronics; Filter Type: Power Line; Number of Lines: 1; DCR: 22mOhm; Object  Type: Part; Design Item ID: FB-BLM18KG700TZ1D; Series: BLM18; Impedance @ Frequency: -; Ratings: AEC-Q200; Operating Temperature: -55°C ~ 125°C; Mounting Type: Surface Mount; Height: 0.75mm; Size: 1.60mm x 0.80mm; Category: Bead
footprint FB0603
pins: 1, 2

## FB-BLM18PG121SH1D
designator FB?  Current Rating: 2A  Package: 0603
FERRITE BEAD 120 OHM 0603 1LN; Manufacturer Part Number: BLM18PG121SH1D; Manufacturer: Murata Electronics; Filter Type: Power Line; Number of Lines: 1; Impedance @ Frequency: 120 Ohms @ 100 MHz; DCR: 50mOhm; Object  Type: Part; Design Item ID: FB-BLM18PG121SH1D; Series: BLM18; Ratings: AEC-Q200; Operating Temperature: -55°C ~ 125°C; Mounting Type: Surface Mount; Height: 0.95mm; Size: 1.60mm x 0.80mm; Category: Bead
footprint FB0603
pins: 1, 2

## FB-BLM18PG121SZ1D
designator FB?  Current Rating: 2A  Package: 0603
FERRITE BEAD 120 OHM 0603 1LN; Manufacturer Part Number: BLM18PG121SZ1D; Manufacturer: Murata Electronics; Filter Type: Power Line; Number of Lines: 1; Impedance @ Frequency: 120 Ohms @ 100 MHz; DCR: 50mOhm; Object  Type: Part; Design Item ID: FB-BLM18PG121SZ1D; Series: BLM18; Ratings: AEC-Q200; Operating Temperature: -55°C ~ 125°C; Mounting Type: Surface Mount; Height: 0.95mm; Size: 1.60mm x 0.80mm; Category: Bead
footprint FB0603
pins: 1, 2

## FB-BLM18PG181SH1D
designator FB?  Current Rating: 1.5A  Package: 0603
FERRITE BEAD 180 OHM 0603 1LN; Manufacturer Part Number: BLM18PG181SH1D; Manufacturer: Murata Electronics; Filter Type: Power Line; Number of Lines: 1; Impedance @ Frequency: 180 Ohms @ 100 MHz; DCR: 90mOhm; Object  Type: Part; Design Item ID: FB-BLM18PG181SH1D; Series: BLM18; Ratings: AEC-Q200; Operating Temperature: -55°C ~ 125°C; Mounting Type: Surface Mount; Height: 0.95mm; Size: 1.60mm x 0.80mm; Category: Bead
footprint FB0603
pins: 1, 2

## FB-BLM18PG221SH1D
designator FB?  Current Rating: 1.4A  Package: 0603
FERRITE BEAD 220 OHM 0603 1LN; Manufacturer Part Number: BLM18PG221SH1D; Manufacturer: Murata Electronics; Filter Type: Power Line; Number of Lines: 1; Impedance @ Frequency: 220 Ohms @ 100 MHz; DCR: 100mOhm; Object  Type: Part; Design Item ID: FB-BLM18PG221SH1D; Series: BLM18; Ratings: AEC-Q200; Operating Temperature: -55°C ~ 125°C; Mounting Type: Surface Mount; Height: 0.95mm; Size: 1.60mm x 0.80mm; Category: Bead
footprint FB0603
pins: 1, 2

## FB-BLM18PG300SH1D
designator FB?  Current Rating: 1A  Package: 0603
FERRITE BEAD 30 OHM 0603 1LN; Manufacturer Part Number: BLM18PG300SH1D; Manufacturer: Murata Electronics; Filter Type: Power Line; Number of Lines: 1; Impedance @ Frequency: 30 Ohms @ 100 MHz; DCR: 50mOhm; Object  Type: Part; Design Item ID: FB-BLM18PG300SH1D; Series: BLM18; Ratings: AEC-Q200; Operating Temperature: -55°C ~ 125°C; Mounting Type: Surface Mount; Height: 0.95mm; Size: 1.60mm x 0.80mm; Category: Bead
footprint FB0603
pins: 1, 2

## FB-BLM18PG330SH1D
designator FB?  Current Rating: 3A  Package: 0603
FERRITE BEAD 33 OHM 0603 1LN; Manufacturer Part Number: BLM18PG330SH1D; Manufacturer: Murata Electronics; Filter Type: Power Line; Number of Lines: 1; Impedance @ Frequency: 33 Ohms @ 100 MHz; DCR: 25mOhm; Object  Type: Part; Design Item ID: FB-BLM18PG330SH1D; Series: BLM18; Ratings: AEC-Q200; Operating Temperature: -55°C ~ 125°C; Mounting Type: Surface Mount; Height: 0.95mm; Size: 1.60mm x 0.80mm; Category: Bead
footprint FB0603
pins: 1, 2

## FB-BLM18PG331SH1D
designator FB?  Current Rating: 1.2A  Package: 0603
FERRITE BEAD 330 OHM 0603 1LN; Manufacturer Part Number: BLM18PG331SH1D; Manufacturer: Murata Electronics; Filter Type: Power Line; Number of Lines: 1; Impedance @ Frequency: 330 Ohms @ 100 MHz; DCR: 150mOhm; Object  Type: Part; Design Item ID: FB-BLM18PG331SH1D; Series: BLM18; Ratings: AEC-Q200; Operating Temperature: -55°C ~ 125°C; Mounting Type: Surface Mount; Height: 0.95mm; Size: 1.60mm x 0.80mm; Category: Bead
footprint FB0603
pins: 1, 2